# Altium footprint library m-BLANC.PcbLib: 53 footprints (part 4 of 4)
Each footprint in its own frame and in the unit in brackets; x right, y up, seen from the top. Pads: shape width x height; smd on the part's side, far side on the other; paste and mask are expansions set on the pad; w line width, h text height; cw(c..) or ccw(c..) is an arc to the next point about the centre after c.
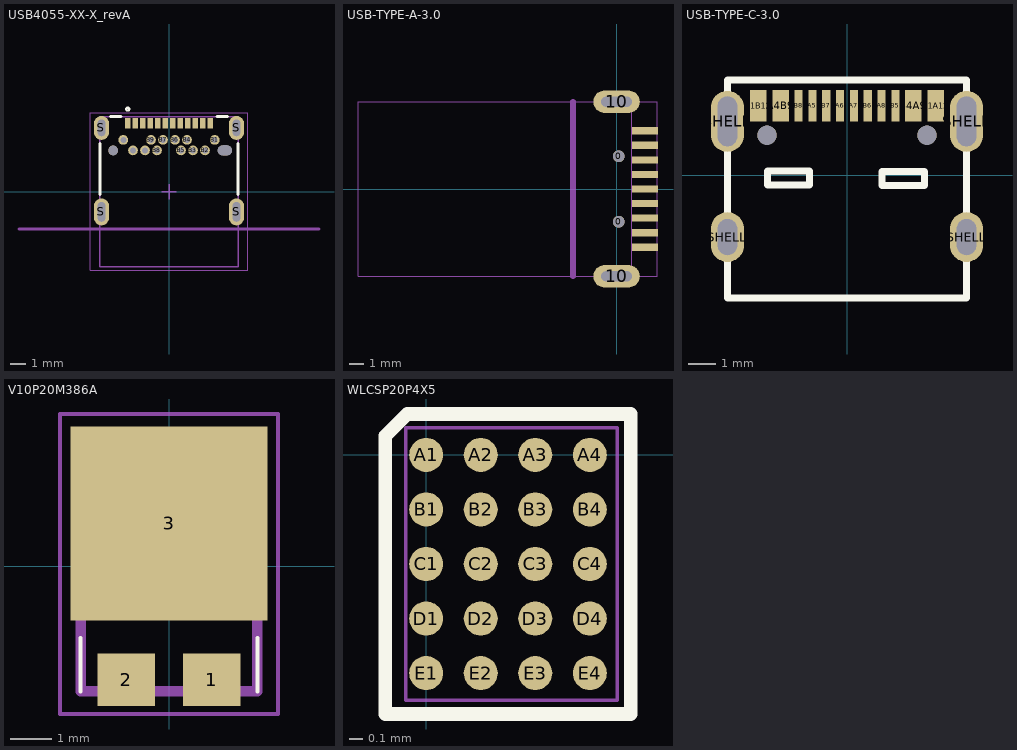
[diagram p3: the footprints below, top view; thin cyan lines are the x and y axes]

## USB4055-XX-X_revA [mm] "Micro USB Receptacle, Type C, Hybrid Type, PCB Top Mount"
height 3.42
pads (30):
  rect 0.35x0.7 smd: A1(-2.75,4.57) A2(-2.25,4.57) A3(-1.75,4.57) A4(-1.25,4.57) A5(-0.75,4.57) A6(-0.25,4.57) A7(0.25,4.57) A8(0.75,4.57) A9(1.25,4.57) A10(1.75,4.57) A11(2.25,4.57) A12(2.75,4.57)
  round 0.65 hole 0.4: B1(3.05,3.45) B2(2.4,2.75) B3(1.6,2.75) B4(1.2,3.45) B5(0.8,2.75) B6(0.4,3.45) B7(-0.4,3.45) B8(-0.8,2.75) B9(-1.2,3.45) B10(-1.6,2.75) B11(-2.4,2.75) B12(-3.05,3.45)
  oval 1x1.8 hole 0.5 slot 1.3 at 90 deg: S(-4.5,-1.35) S(4.5,-1.35)
  oval 1x1.6 hole 0.5 slot 1.1 at 90 deg: S(-4.5,4.25) S(4.5,4.25)
  round 0.65 hole 0.65 unplated: ""(-3.725,2.75)
  oval 0.95x0.65 hole 0.65 slot 0.95 at 0 deg unplated: ""(3.725,2.75)
Top Overlay:
  circle w0.15: c-2.75,5.5 r0.1
  lines w0.2: -4.6,-0.2 -4.6,3.2 ; -3.9,5 -3.2,5 ; 3.2,5 3.9,5 ; 4.6,-0.2 4.6,3.2
Mechanical 1:
  lines w0.2: -10,-2.5 10,-2.5
  text "PCB Edge" at -10,-3.35 h0.5
Mechanical 13:
  lines w0.1: -4.6,-5 -4.6,5 4.6,5 4.6,-5 -4.6,-5
Mechanical 15:
  lines w0.05: -5.25,-5.25 5.25,-5.25 5.25,5.25 -5.25,5.25 -5.25,-5.25
  lines w0.1: -0.5,0 0.5,0 ; 0,-0.5 0,0.5
3D body "usb4055-30-a_reva.step": height 3.5, standoff -1.16, extent -4.856,-5 4.856,5

## USB-TYPE-A-3.0 [mm]
pads (13):
  round 0.8 hole 0.8 unplated: 0(0.15,-2.25) 0(0.15,2.25)
  rect 1.8x0.5 smd: 1(1.95,-4) 2(1.95,-3) 3(1.95,-2) 4(1.95,-1) 5(1.95,0) 6(1.95,1) 7(1.95,2) 8(1.95,3) 9(1.95,4)
  oval 3.2x1.55 hole 0.7 slot 2.1 at 0 deg: 10(0,-6) 10(0,6)
Mechanical 4:
  lines w0.05: -17.776,-6 -17.776,6 2.8,6 2.8,-6 -17.776,-6
  lines w0.4: -3,-6 -3,6
  text "PCB Edge" at -3.9,-4.4 h1.97
Mechanical 15:
  lines w0.05: -17.776,-6 -17.776,6 1.05,6 1.05,-6 -17.776,-6
3D body: height 1.5, standoff 0, extent -17.801,-6.025 1.075,6.025

## USB-TYPE-C-3.0 [mm]
pads (18):
  rect 0.6x1.15 smd: A1B12(-3.201,2.515) A4B9(-2.401,2.515) B1A12(3.199,2.515) B4A9(2.399,2.515)
  rect 0.3x1.15 smd: A5(-1.251,2.515) A6(-0.251,2.515) A7(0.249,2.515) A8(1.249,2.515) B5(1.749,2.515) B6(0.749,2.515) B7(-0.751,2.515) B8(-1.751,2.515)
  oval 1.2x1.8 hole 0.7 slot 1.3 at 90 deg: SHELL(-4.321,-2.23) SHELL(4.319,-2.23)
  oval 1.2x2.2 hole 0.7 slot 1.8 at 90 deg: SHELL(-4.321,1.95) SHELL(4.319,1.95)
  round 0.7 hole 0.7 unplated: ""(-2.891,1.45) ""(2.889,1.45)
Top Overlay:
  lines w0.254: -4.319,-4.429 -4.319,3.445 4.317,3.445 4.317,-4.429 -4.319,-4.429 ; -2.874,-0.354 -2.874,0.154 -1.35,0.154 -1.35,-0.354 -2.874,-0.354 ; 1.269,-0.365 1.269,0.143 2.793,0.143 2.793,-0.365 1.269,-0.365
3D body "USB Type C Port (SMD Type).STEP": height 3.22, standoff -0.98, extent -4.47,-4.8 4.47,3.1

## V10P20M386A [mm]
pads (3):
  rect 1.4x1.27 smd: 1(1.04,-2.765) 2(-1.04,-2.765)
  rect 4.8x4.72 smd: 3(0,1.04)
Top Overlay:
  lines w0.1: -2.15,-3.05 -2.15,-1.75 ; 2.15,-3.05 2.15,-1.75
Mechanical 13:
  lines w0.254: -2.15,-3.05 -2.15,3.05 2.15,3.05 2.15,-3.05 -2.15,-3.05
Mechanical 15:
  lines w0.1: -2.65,-3.6 -2.65,3.7 2.65,3.7 2.65,-3.6 -2.65,-3.6
3D body "V10P20-M3_86A.stp": height 1.3, standoff 0, extent -2.15,-3.273 2.15,3.05

## WLCSP20P4X5 [mm]
pads (20):
  round 0.25 smd: A1(0,0) A2(0.4,0) A3(0.8,0) A4(1.2,0) B1(0,-0.4) B2(0.4,-0.4) B3(0.8,-0.4) B4(1.2,-0.4) C1(0,-0.8) C2(0.4,-0.8) C3(0.8,-0.8) C4(1.2,-0.8) D1(0,-1.2) D2(0.4,-1.2) D3(0.8,-1.2) D4(1.2,-1.2) E1(0,-1.6) E2(0.4,-1.6) E3(0.8,-1.6) E4(1.2,-1.6)
Top Overlay:
  lines w0.1: -0.3,-1.9 -0.3,0.139 -0.139,0.3 1.5,0.3 1.5,-1.9 -0.3,-1.9
Mechanical 15:
  lines w0.025: -0.15,-1.8 1.4,-1.8 1.4,0.2 -0.15,0.2 -0.15,-1.8
3D body: height 0.56, standoff 0, extent -0.15,-1.801 1.402,0.197